# Altium integrated library TI Power Management Battery Management.IntLib: 950 symbols (part 12 of 48) (continued)
## BQ2054SNG4 (continued)

## BQ2054SNTR
designator U?
Switch-Mode Li-Ion Battery Charger in PDIP or SOIC Package, 4.5 V, 16-pin SOIC (D), Green (RoHS & no Sb/Br); PartNumber: BQ2054SNTR; Manufacturer: Texas Instruments; Lead Acid: N; Li-Ion: Y; SubFamily: Battery Charge Management; Vin(Min)(V): 4.5; PackageVersion: revM, Jun-2011; PackageReference: D16; PackageDescription: 16-Pin Plastic Small Outline Integrated Circuit, 9.9 x 3.9 mm, Pitch 1.27 mm Pitch; Supplier 1: Digi-Key; Supplier Part Number 1: BQ2054SNTR-ND; Supplier Part Number 3: 595-BQ2054SNTR; Eco-Plan: Green (RoHS & no Sb/Br); Li-Polymer: Y; NiCd: N; NiMH: N; Over Voltage Protection: N; Mounting Technology: Surface Mount; Code_JEDEC: MS-012AC; ComponentLink1Description: Datasheet; ComponentLink1URL: http://www.ti.com/general/docs/lit/getliterature.tsp?genericPartNumber=BQ2054&fileType=pdf
footprint D16_N (SOIC, 16-Leads, Body 9.9x3.9mm, Pitch 1.27mm, IPC Medium Density)
footprint D16_L (SOIC, 16-Leads, Body 9.9x3.9mm, Pitch 1.27mm, IPC High Density)
footprint D16_M (SOIC, 16-Leads, Body 9.9x3.9mm, Pitch 1.27mm, IPC Low Density)
pins: 1 TM (in) "This input sets the maximum charge time.The resistor and capacitor values are determined using Equation 5. Figure 7 shows the resistor/capacitor connection.", 2 ~{ICTL} (out) "I\C\T\L\ is driven low during the fault or charge-complete states of the chip. It is used to disconnect the capacitor across the battery pack terminals, preventing inrush currents from tripping overcurrent protection (See Datasheet)", 3 BAT (in) "BAT is the battery voltage sense input. This potential is generally developed using a high-impedance resistor divider network connected between the positive and the negative terminals of the battery. See Figure 4 and (See Datasheet)", 4 VCOMP (in) "This input uses an external R-C network for voltage loop stability", 5 ICOMP (in) "This input uses an external R-C network for current loop stability.", 6 ITERM "This three-state input is used to set IMIN for fast charge termination. See Table 2.", 7 SNS (in) "Battery current is sensed via the voltage developed on this pin by an external sense resistor,RSNS, connected in series with the negative terminal of the battery pack. See Equation 6.", 8 TS (in) "This input is used to monitor battery temperature.An external resistor divider network sets the lower and upper temperature thresholds.See Figure 6 and Equations 3 and 4.", 9 TPWM (in) "This input uses an external timing capacitor to ground to set the pulse-width modulation (PWM) frequency. See Equation 7.", 10 LED3 (hiz) "This charger status output driver is for the direct drive of the LED display. Display modes are shown in Table 1. These outputs are tri-stated during initialization so that DSEL can be read.", 11 LCOM (hiz) "Common output for LED1-3. This output is in a high-impedance state during initialization to read programming input on DSEL.", 12 VSS (power) "Ground", 13 VCC (power) "5.0V, +/- 10% power", 14 MOD (out) "MOD is a pulse-width modulated push/pull output that is used to control the charging current to the battery. MOD switches high to enable current flow and low to inhibit current flow.", 15 LED1 (hiz) "This charger status output driver is for the direct drive of the LED display. Display modes are shown in Table 1. This output is tri-stated during initialization so that DSEL can be read.", 16 LED2/DSEL (io) "This charger status output driver is for the direct drive of the LED display. Display modes are shown in Table 1. This output is tri-stated during initialization so that DSEL can be read./This three-level input controls the (See Datasheet)"

## BQ2054SNTRG4
designator U?
Switch-Mode Li-Ion Battery Charger in PDIP or SOIC Package, 4.5 V, 16-pin SOIC (D), Green (RoHS & no Sb/Br); PartNumber: BQ2054SNTRG4; Manufacturer: Texas Instruments; Lead Acid: N; Li-Ion: Y; SubFamily: Battery Charge Management; Vin(Min)(V): 4.5; PackageVersion: revM, Jun-2011; PackageReference: D16; PackageDescription: 16-Pin Plastic Small Outline Integrated Circuit, 9.9 x 3.9 mm, Pitch 1.27 mm Pitch; Supplier 1: Digi-Key; Supplier Part Number 1: BQ2054SNTRG4-ND; Supplier Part Number 3: 595-BQ2054SNTRG4; Eco-Plan: Green (RoHS & no Sb/Br); Li-Polymer: Y; NiCd: N; NiMH: N; Over Voltage Protection: N; Mounting Technology: Surface Mount; Code_JEDEC: MS-012AC; ComponentLink1Description: Datasheet; ComponentLink1URL: http://www.ti.com/general/docs/lit/getliterature.tsp?genericPartNumber=BQ2054&fileType=pdf
footprint D16_N (SOIC, 16-Leads, Body 9.9x3.9mm, Pitch 1.27mm, IPC Medium Density)
footprint D16_L (SOIC, 16-Leads, Body 9.9x3.9mm, Pitch 1.27mm, IPC High Density)
footprint D16_M (SOIC, 16-Leads, Body 9.9x3.9mm, Pitch 1.27mm, IPC Low Density)
pins: 1 TM (in) "This input sets the maximum charge time.The resistor and capacitor values are determined using Equation 5. Figure 7 shows the resistor/capacitor connection.", 2 ~{ICTL} (out) "I\C\T\L\ is driven low during the fault or charge-complete states of the chip. It is used to disconnect the capacitor across the battery pack terminals, preventing inrush currents from tripping overcurrent protection (See Datasheet)", 3 BAT (in) "BAT is the battery voltage sense input. This potential is generally developed using a high-impedance resistor divider network connected between the positive and the negative terminals of the battery. See Figure 4 and (See Datasheet)", 4 VCOMP (in) "This input uses an external R-C network for voltage loop stability", 5 ICOMP (in) "This input uses an external R-C network for current loop stability.", 6 ITERM "This three-state input is used to set IMIN for fast charge termination. See Table 2.", 7 SNS (in) "Battery current is sensed via the voltage developed on this pin by an external sense resistor,RSNS, connected in series with the negative terminal of the battery pack. See Equation 6.", 8 TS (in) "This input is used to monitor battery temperature.An external resistor divider network sets the lower and upper temperature thresholds.See Figure 6 and Equations 3 and 4.", 9 TPWM (in) "This input uses an external timing capacitor to ground to set the pulse-width modulation (PWM) frequency. See Equation 7.", 10 LED3 (hiz) "This charger status output driver is for the direct drive of the LED display. Display modes are shown in Table 1. These outputs are tri-stated during initialization so that DSEL can be read.", 11 LCOM (hiz) "Common output for LED1-3. This output is in a high-impedance state during initialization to read programming input on DSEL.", 12 VSS (power) "Ground", 13 VCC (power) "5.0V, +/- 10% power", 14 MOD (out) "MOD is a pulse-width modulated push/pull output that is used to control the charging current to the battery. MOD switches high to enable current flow and low to inhibit current flow.", 15 LED1 (hiz) "This charger status output driver is for the direct drive of the LED display. Display modes are shown in Table 1. This output is tri-stated during initialization so that DSEL can be read.", 16 LED2/DSEL (io) "This charger status output driver is for the direct drive of the LED display. Display modes are shown in Table 1. This output is tri-stated during initialization so that DSEL can be read./This three-level input controls the (See Datasheet)"

## BQ2057CDGK
designator U?
Low Dropout Linear 1-Cell Li-Ion Charge Controller with AutoCompTM, 4.5 V, -20 to 70 degC, 8-pin MSOP (DGK), Green (RoHS & no Sb/Br); PartNumber: BQ2057CDGK; Manufacturer: Texas Instruments; Lead Acid: N; Li-Ion: Y; SubFamily: Battery Charge Management; Vin(Min)(V): 4.5; DatasheetVersion: SLUS025F; PackageVersion: revE, May-2006; PackageReference: DGK8; PackageDescription: 8-Pin Thin Small Outline Package 3 x 3 mm Body ,0.65 mm Pitch; Supplier 1: Digi-Key; Supplier Part Number 1: 296-11991-5-ND; Supplier Part Number 3: 595-BQ2057CDGK; Eco-Plan: Green (RoHS & no Sb/Br); Li-Polymer: Y; NiCd: N; NiMH: N; Over Voltage Protection: N; Mounting Technology: Surface Mount; Code_JEDEC: MO-187-AA; ComponentLink1Description: Datasheet; ComponentLink1URL: http://www.ti.com/general/docs/lit/getliterature.tsp?genericPartNumber=BQ2057C&fileType=pdf
footprint DGK8_N (TSOP, 8-Leads, Body 3x3mm, Pitch 0.65mm, IPC Medium Density)
footprint DGK8_L (TSOP, 8-Leads, Body 3x3mm, Pitch 0.65mm, IPC High Density)
footprint DGK8_M (TSOP, 8-Leads, Body 3x3mm, Pitch 0.65mm, IPC Low Density)
pins: 1 VCC (power) "Supply voltage", 2 TS (in) "Temperature sense input", 3 STAT (hiz) "Charge status output", 4 VSS (power) "Ground", 5 CC (out) "Charge control output", 6 COMP (in) "Charge-rate compensation input (AutoComp)", 7 SNS (in) "Current sense input", 8 BAT (in) "Voltage sense input"

## BQ2057CDGKG4
designator U?
Low Dropout Linear 1-Cell Li-Ion Charge Controller with AutoCompTM, 4.5 V, -20 to 70 degC, 8-pin MSOP (DGK), Green (RoHS & no Sb/Br); PartNumber: BQ2057CDGKG4; Manufacturer: Texas Instruments; Lead Acid: N; Li-Ion: Y; SubFamily: Battery Charge Management; Vin(Min)(V): 4.5; DatasheetVersion: SLUS025F; PackageVersion: revE, May-2006; PackageReference: DGK8; PackageDescription: 8-Pin Thin Small Outline Package 3 x 3 mm Body ,0.65 mm Pitch; Supplier 1: Digi-Key; Supplier Part Number 1: BQ2057CDGKG4-ND; Supplier Part Number 3: 595-BQ2057CDGKG4; Eco-Plan: Green (RoHS & no Sb/Br); Li-Polymer: Y; NiCd: N; NiMH: N; Over Voltage Protection: N; Mounting Technology: Surface Mount; Code_JEDEC: MO-187-AA; ComponentLink1Description: Datasheet; ComponentLink1URL: http://www.ti.com/general/docs/lit/getliterature.tsp?genericPartNumber=BQ2057C&fileType=pdf
footprint DGK8_N (TSOP, 8-Leads, Body 3x3mm, Pitch 0.65mm, IPC Medium Density)
footprint DGK8_L (TSOP, 8-Leads, Body 3x3mm, Pitch 0.65mm, IPC High Density)
footprint DGK8_M (TSOP, 8-Leads, Body 3x3mm, Pitch 0.65mm, IPC Low Density)
pins: 1 VCC (power) "Supply voltage", 2 TS (in) "Temperature sense input", 3 STAT (hiz) "Charge status output", 4 VSS (power) "Ground", 5 CC (out) "Charge control output", 6 COMP (in) "Charge-rate compensation input (AutoComp)", 7 SNS (in) "Current sense input", 8 BAT (in) "Voltage sense input"

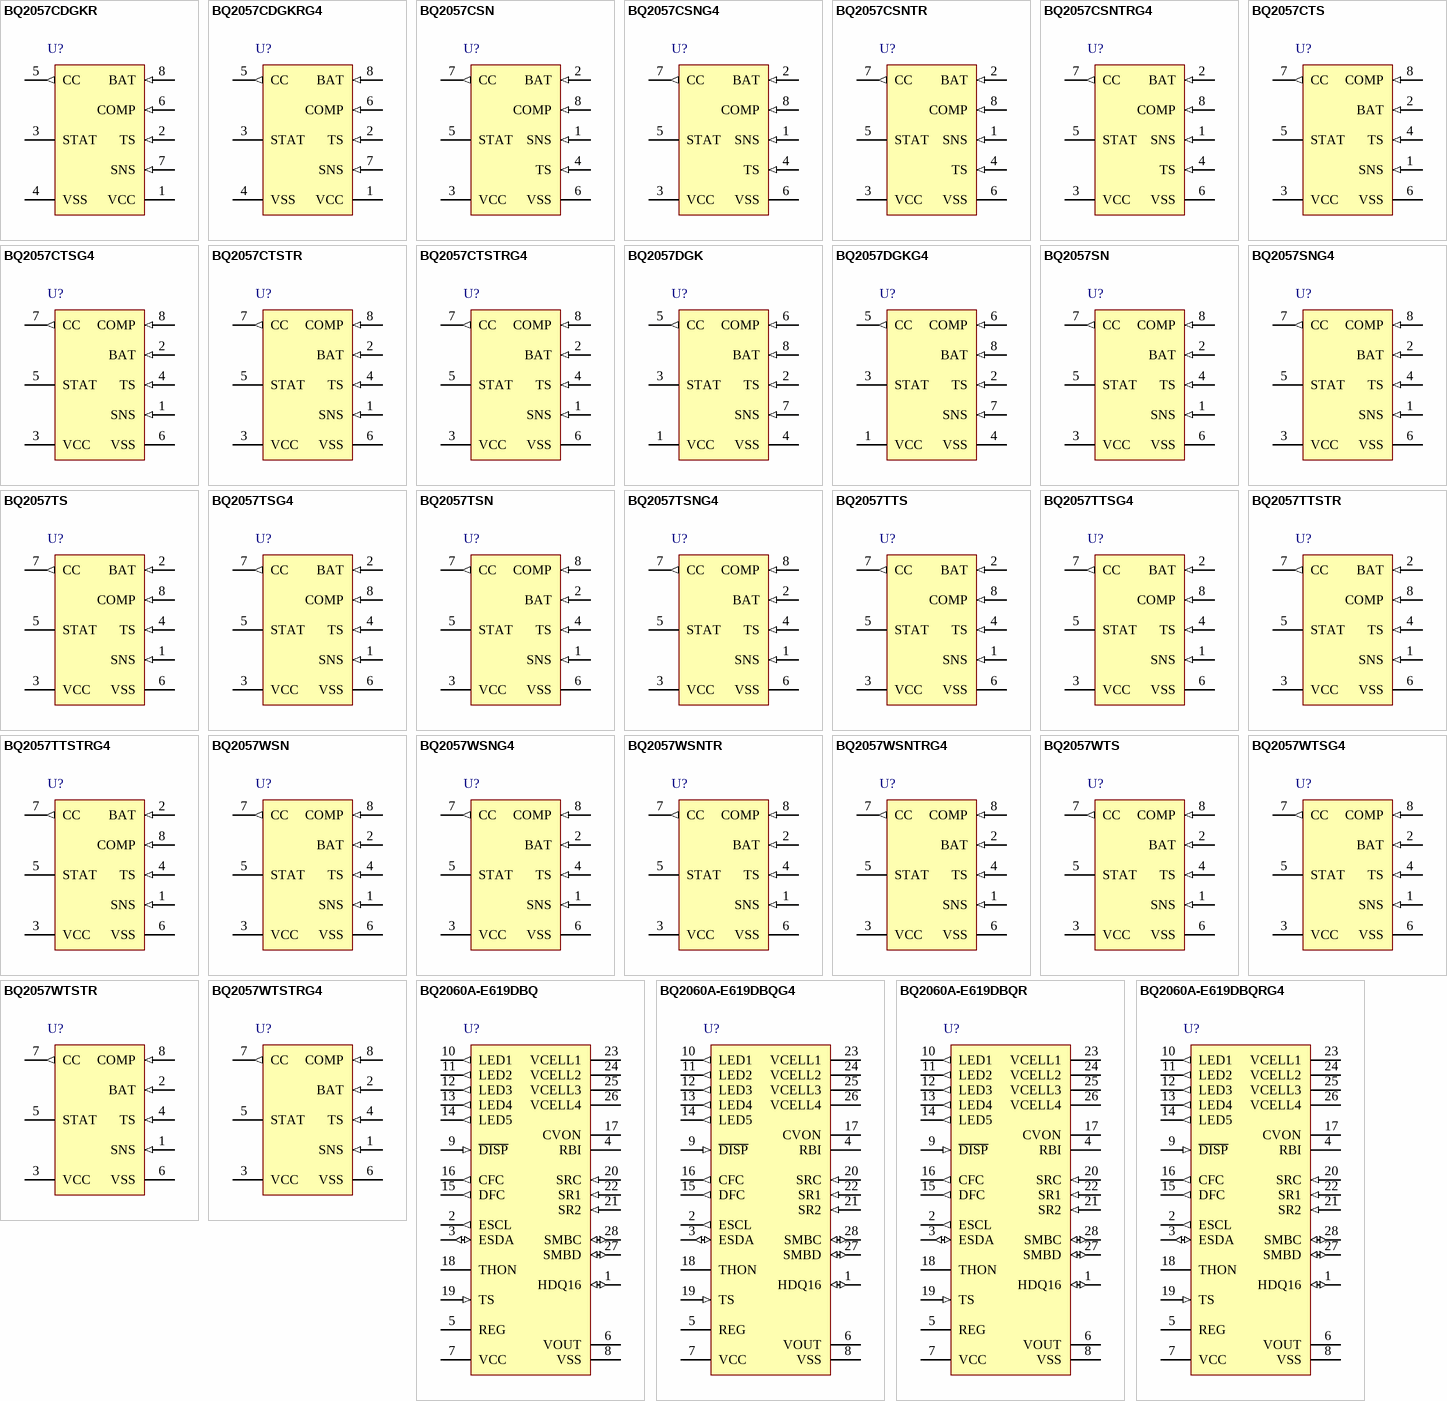
[diagram p8: symbols BQ2057CDGKR to BQ2060A-E619DBQRG4]

## BQ2057CDGKR
designator U?
Low Dropout Linear 1-Cell Li-Ion Charge Controller with AutoCompTM, 4.5 V, -20 to 70 degC, 8-pin MSOP (DGK), Green (RoHS & no Sb/Br); PartNumber: BQ2057CDGKR; Manufacturer: Texas Instruments; Lead Acid: N; Li-Ion: Y; SubFamily: Battery Charge Management; Vin(Min)(V): 4.5; DatasheetVersion: SLUS025F; PackageVersion: revE, May-2006; PackageReference: DGK8; PackageDescription: 8-Pin Thin Small Outline Package 3 x 3 mm Body ,0.65 mm Pitch; Supplier 1: Digi-Key; Supplier Part Number 1: 296-11991-2-ND; Supplier Part Number 3: 296-11991-6-ND; Eco-Plan: Green (RoHS & no Sb/Br); Li-Polymer: Y; NiCd: N; NiMH: N; Over Voltage Protection: N; Mounting Technology: Surface Mount; Code_JEDEC: MO-187-AA; ComponentLink1Description: Datasheet; ComponentLink1URL: http://www.ti.com/general/docs/lit/getliterature.tsp?genericPartNumber=BQ2057C&fileType=pdf
footprint DGK8_N (TSOP, 8-Leads, Body 3x3mm, Pitch 0.65mm, IPC Medium Density)
footprint DGK8_L (TSOP, 8-Leads, Body 3x3mm, Pitch 0.65mm, IPC High Density)
footprint DGK8_M (TSOP, 8-Leads, Body 3x3mm, Pitch 0.65mm, IPC Low Density)
pins: 1 VCC (power) "Supply voltage", 2 TS (in) "Temperature sense input", 3 STAT (hiz) "Charge status output", 4 VSS (power) "Ground", 5 CC (out) "Charge control output", 6 COMP (in) "Charge-rate compensation input (AutoComp)", 7 SNS (in) "Current sense input", 8 BAT (in) "Voltage sense input"

## BQ2057CDGKRG4
designator U?
Low Dropout Linear 1-Cell Li-Ion Charge Controller with AutoCompTM, 4.5 V, -20 to 70 degC, 8-pin MSOP (DGK), Green (RoHS & no Sb/Br); PartNumber: BQ2057CDGKRG4; Manufacturer: Texas Instruments; Lead Acid: N; Li-Ion: Y; SubFamily: Battery Charge Management; Vin(Min)(V): 4.5; DatasheetVersion: SLUS025F; PackageVersion: revE, May-2006; PackageReference: DGK8; PackageDescription: 8-Pin Thin Small Outline Package 3 x 3 mm Body ,0.65 mm Pitch; Supplier 1: Digi-Key; Supplier Part Number 1: BQ2057CDGKRG4-ND; Supplier Part Number 3: 595-BQ2057CDGKRG4; Eco-Plan: Green (RoHS & no Sb/Br); Li-Polymer: Y; NiCd: N; NiMH: N; Over Voltage Protection: N; Mounting Technology: Surface Mount; Code_JEDEC: MO-187-AA; ComponentLink1Description: Datasheet; ComponentLink1URL: http://www.ti.com/general/docs/lit/getliterature.tsp?genericPartNumber=BQ2057C&fileType=pdf
footprint DGK8_N (TSOP, 8-Leads, Body 3x3mm, Pitch 0.65mm, IPC Medium Density)
footprint DGK8_L (TSOP, 8-Leads, Body 3x3mm, Pitch 0.65mm, IPC High Density)
footprint DGK8_M (TSOP, 8-Leads, Body 3x3mm, Pitch 0.65mm, IPC Low Density)
pins: 1 VCC (power) "Supply voltage", 2 TS (in) "Temperature sense input", 3 STAT (hiz) "Charge status output", 4 VSS (power) "Ground", 5 CC (out) "Charge control output", 6 COMP (in) "Charge-rate compensation input (AutoComp)", 7 SNS (in) "Current sense input", 8 BAT (in) "Voltage sense input"

## BQ2057CSN
designator U?
Low Dropout Linear 1-Cell Li-Ion Charge Controller with AutoCompTM, 4.5 V, -20 to 70 degC, 8-pin SOIC (D), Green (RoHS & no Sb/Br); PartNumber: BQ2057CSN; Manufacturer: Texas Instruments; Lead Acid: N; Li-Ion: Y; SubFamily: Battery Charge Management; Vin(Min)(V): 4.5; DatasheetVersion: SLUS025F; PackageVersion: revM, Jun-2011; PackageReference: D8; PackageDescription: 8-Pin Plastic Small Outline Integrated Circuit, 4.9 x 3.9 mm, Pitch 1.27 mm Pitch; Supplier 1: Digi-Key; Supplier Part Number 1: 296-9358-5-ND; Supplier Part Number 3: 74C7587; Eco-Plan: Green (RoHS & no Sb/Br); Li-Polymer: Y; NiCd: N; NiMH: N; Over Voltage Protection: N; Mounting Technology: Surface Mount; Code_JEDEC: MS-012AA; ComponentLink1Description: Datasheet; ComponentLink1URL: http://www.ti.com/general/docs/lit/getliterature.tsp?genericPartNumber=BQ2057C&fileType=pdf
footprint D8_N (SOIC, 8-Leads, Body 4.9x3.9mm, Pitch 1.27mm, IPC Medium Density)
footprint D8_L (SOIC, 8-Leads, Body 4.9x3.9mm, Pitch 1.27mm, IPC High Density)
footprint D8_M (SOIC, 8-Leads, Body 4.9x3.9mm, Pitch 1.27mm, IPC Low Density)
pins: 1 SNS (in) "Current sense input", 2 BAT (in) "Voltage sense input", 3 VCC (power) "Supply voltage", 4 TS (in) "Temperature sense input", 5 STAT (hiz) "Charge status output", 6 VSS (power) "Ground", 7 CC (out) "Charge control output", 8 COMP (in) "Charge-rate compensation input (AutoComp)"

## BQ2057CSNG4
designator U?
Low Dropout Linear 1-Cell Li-Ion Charge Controller with AutoCompTM, 4.5 V, -20 to 70 degC, 8-pin SOIC (D), Green (RoHS & no Sb/Br); PartNumber: BQ2057CSNG4; Manufacturer: Texas Instruments; Lead Acid: N; Li-Ion: Y; SubFamily: Battery Charge Management; Vin(Min)(V): 4.5; DatasheetVersion: SLUS025F; PackageVersion: revM, Jun-2011; PackageReference: D8; PackageDescription: 8-Pin Plastic Small Outline Integrated Circuit, 4.9 x 3.9 mm, Pitch 1.27 mm Pitch; Supplier 1: Digi-Key; Supplier Part Number 1: BQ2057CSNG4-ND; Supplier Part Number 3: 595-BQ2057CSNG4; Eco-Plan: Green (RoHS & no Sb/Br); Li-Polymer: Y; NiCd: N; NiMH: N; Over Voltage Protection: N; Mounting Technology: Surface Mount; Code_JEDEC: MS-012AA; ComponentLink1Description: Datasheet; ComponentLink1URL: http://www.ti.com/general/docs/lit/getliterature.tsp?genericPartNumber=BQ2057C&fileType=pdf
footprint D8_N (SOIC, 8-Leads, Body 4.9x3.9mm, Pitch 1.27mm, IPC Medium Density)
footprint D8_L (SOIC, 8-Leads, Body 4.9x3.9mm, Pitch 1.27mm, IPC High Density)
footprint D8_M (SOIC, 8-Leads, Body 4.9x3.9mm, Pitch 1.27mm, IPC Low Density)
pins: 1 SNS (in) "Current sense input", 2 BAT (in) "Voltage sense input", 3 VCC (power) "Supply voltage", 4 TS (in) "Temperature sense input", 5 STAT (hiz) "Charge status output", 6 VSS (power) "Ground", 7 CC (out) "Charge control output", 8 COMP (in) "Charge-rate compensation input (AutoComp)"

## BQ2057CSNTR
designator U?
Low Dropout Linear 1-Cell Li-Ion Charge Controller with AutoCompTM, 4.5 V, -20 to 70 degC, 8-pin SOIC (D), Green (RoHS & no Sb/Br); PartNumber: BQ2057CSNTR; Manufacturer: Texas Instruments; Lead Acid: N; Li-Ion: Y; SubFamily: Battery Charge Management; Vin(Min)(V): 4.5; DatasheetVersion: SLUS025F; PackageVersion: revM, Jun-2011; PackageReference: D8; PackageDescription: 8-Pin Plastic Small Outline Integrated Circuit, 4.9 x 3.9 mm, Pitch 1.27 mm Pitch; Supplier 1: Digi-Key; Supplier Part Number 1: BQ2057CSNTR-ND; Supplier Part Number 3: 595-BQ2057CSNTR; Eco-Plan: Green (RoHS & no Sb/Br); Li-Polymer: Y; NiCd: N; NiMH: N; Over Voltage Protection: N; Mounting Technology: Surface Mount; Code_JEDEC: MS-012AA; ComponentLink1Description: Datasheet; ComponentLink1URL: http://www.ti.com/general/docs/lit/getliterature.tsp?genericPartNumber=BQ2057C&fileType=pdf
footprint D8_N (SOIC, 8-Leads, Body 4.9x3.9mm, Pitch 1.27mm, IPC Medium Density)
footprint D8_L (SOIC, 8-Leads, Body 4.9x3.9mm, Pitch 1.27mm, IPC High Density)
footprint D8_M (SOIC, 8-Leads, Body 4.9x3.9mm, Pitch 1.27mm, IPC Low Density)
pins: 1 SNS (in) "Current sense input", 2 BAT (in) "Voltage sense input", 3 VCC (power) "Supply voltage", 4 TS (in) "Temperature sense input", 5 STAT (hiz) "Charge status output", 6 VSS (power) "Ground", 7 CC (out) "Charge control output", 8 COMP (in) "Charge-rate compensation input (AutoComp)"

## BQ2057CSNTRG4
designator U?
Low Dropout Linear 1-Cell Li-Ion Charge Controller with AutoCompTM, 4.5 V, -20 to 70 degC, 8-pin SOIC (D), Green (RoHS & no Sb/Br); PartNumber: BQ2057CSNTRG4; Manufacturer: Texas Instruments; Lead Acid: N; Li-Ion: Y; SubFamily: Battery Charge Management; Vin(Min)(V): 4.5; DatasheetVersion: SLUS025F; PackageVersion: revM, Jun-2011; PackageReference: D8; PackageDescription: 8-Pin Plastic Small Outline Integrated Circuit, 4.9 x 3.9 mm, Pitch 1.27 mm Pitch; Supplier 1: Digi-Key; Supplier Part Number 1: BQ2057CSNTRG4-ND; Supplier Part Number 3: 595-BQ2057CSNTRG4; Eco-Plan: Green (RoHS & no Sb/Br); Li-Polymer: Y; NiCd: N; NiMH: N; Over Voltage Protection: N; Mounting Technology: Surface Mount; Code_JEDEC: MS-012AA; ComponentLink1Description: Datasheet; ComponentLink1URL: http://www.ti.com/general/docs/lit/getliterature.tsp?genericPartNumber=BQ2057C&fileType=pdf
footprint D8_N (SOIC, 8-Leads, Body 4.9x3.9mm, Pitch 1.27mm, IPC Medium Density)
footprint D8_L (SOIC, 8-Leads, Body 4.9x3.9mm, Pitch 1.27mm, IPC High Density)
footprint D8_M (SOIC, 8-Leads, Body 4.9x3.9mm, Pitch 1.27mm, IPC Low Density)
pins: 1 SNS (in) "Current sense input", 2 BAT (in) "Voltage sense input", 3 VCC (power) "Supply voltage", 4 TS (in) "Temperature sense input", 5 STAT (hiz) "Charge status output", 6 VSS (power) "Ground", 7 CC (out) "Charge control output", 8 COMP (in) "Charge-rate compensation input (AutoComp)"

## BQ2057CTS
designator U?
Low Dropout Linear 1-Cell Li-Ion Charge Controller with AutoCompTM, 4.5 V, -20 to 70 degC, 8-pin TSSOP (PW), Green (RoHS & no Sb/Br); PartNumber: BQ2057CTS; Manufacturer: Texas Instruments; Lead Acid: N; Li-Ion: Y; SubFamily: Battery Charge Management; Vin(Min)(V): 4.5; DatasheetVersion: SLUS025F; PackageVersion: revG, Feb-2011; PackageReference: PW8; PackageDescription: 8-Pin Plastic Thin Small Outline Package 3 x 4.4 mm Body ,0.65 mm Pitch; Supplier 1: Digi-Key; Supplier Part Number 1: 296-9359-5-ND; Supplier Part Number 3: 595-BQ2057CTS; Eco-Plan: Green (RoHS & no Sb/Br); Li-Polymer: Y; NiCd: N; NiMH: N; Over Voltage Protection: N; Mounting Technology: Surface Mount; Code_JEDEC: MO-153; ComponentLink1Description: Datasheet; ComponentLink1URL: http://www.ti.com/general/docs/lit/getliterature.tsp?genericPartNumber=BQ2057C&fileType=pdf
footprint PW8_N (TSOP, 8-Leads, Body 3x4.4mm, Pitch 0.65mm, IPC Medium Density)
footprint PW8_L (TSOP, 8-Leads, Body 3x4.4mm, Pitch 0.65mm, IPC High Density)
footprint PW8_M (TSOP, 8-Leads, Body 3x4.4mm, Pitch 0.65mm, IPC Low Density)
pins: 1 SNS (in) "Current sense input", 2 BAT (in) "Voltage sense input", 3 VCC (power) "Supply voltage", 4 TS (in) "Temperature sense input", 5 STAT (hiz) "Charge status output", 6 VSS (power) "Ground", 7 CC (out) "Charge control output", 8 COMP (in) "Charge-rate compensation input (AutoComp)"

## BQ2057CTSG4
designator U?
Low Dropout Linear 1-Cell Li-Ion Charge Controller with AutoCompTM, 4.5 V, -20 to 70 degC, 8-pin TSSOP (PW), Green (RoHS & no Sb/Br); PartNumber: BQ2057CTSG4; Manufacturer: Texas Instruments; Lead Acid: N; Li-Ion: Y; SubFamily: Battery Charge Management; Vin(Min)(V): 4.5; DatasheetVersion: SLUS025F; PackageVersion: revG, Feb-2011; PackageReference: PW8; PackageDescription: 8-Pin Plastic Thin Small Outline Package 3 x 4.4 mm Body ,0.65 mm Pitch; Supplier 1: Digi-Key; Supplier Part Number 1: BQ2057CTSG4-ND; Supplier Part Number 3: 58K5575; Eco-Plan: Green (RoHS & no Sb/Br); Li-Polymer: Y; NiCd: N; NiMH: N; Over Voltage Protection: N; Mounting Technology: Surface Mount; Code_JEDEC: MO-153; ComponentLink1Description: Datasheet; ComponentLink1URL: http://www.ti.com/general/docs/lit/getliterature.tsp?genericPartNumber=BQ2057C&fileType=pdf
footprint PW8_N (TSOP, 8-Leads, Body 3x4.4mm, Pitch 0.65mm, IPC Medium Density)
footprint PW8_L (TSOP, 8-Leads, Body 3x4.4mm, Pitch 0.65mm, IPC High Density)
footprint PW8_M (TSOP, 8-Leads, Body 3x4.4mm, Pitch 0.65mm, IPC Low Density)
pins: 1 SNS (in) "Current sense input", 2 BAT (in) "Voltage sense input", 3 VCC (power) "Supply voltage", 4 TS (in) "Temperature sense input", 5 STAT (hiz) "Charge status output", 6 VSS (power) "Ground", 7 CC (out) "Charge control output", 8 COMP (in) "Charge-rate compensation input (AutoComp)"

## BQ2057CTSTR
designator U?
Low Dropout Linear 1-Cell Li-Ion Charge Controller with AutoCompTM, 4.5 V, -20 to 70 degC, 8-pin TSSOP (PW), Green (RoHS & no Sb/Br); PartNumber: BQ2057CTSTR; Manufacturer: Texas Instruments; Lead Acid: N; Li-Ion: Y; SubFamily: Battery Charge Management; Vin(Min)(V): 4.5; DatasheetVersion: SLUS025F; PackageVersion: revG, Feb-2011; PackageReference: PW8; PackageDescription: 8-Pin Plastic Thin Small Outline Package 3 x 4.4 mm Body ,0.65 mm Pitch; Supplier 1: Digi-Key; Supplier Part Number 1: 296-25916-2-ND; Supplier Part Number 3: 296-25916-6-ND; Eco-Plan: Green (RoHS & no Sb/Br); Li-Polymer: Y; NiCd: N; NiMH: N; Over Voltage Protection: N; Mounting Technology: Surface Mount; Code_JEDEC: MO-153; ComponentLink1Description: Datasheet; ComponentLink1URL: http://www.ti.com/general/docs/lit/getliterature.tsp?genericPartNumber=BQ2057C&fileType=pdf
footprint PW8_N (TSOP, 8-Leads, Body 3x4.4mm, Pitch 0.65mm, IPC Medium Density)
footprint PW8_L (TSOP, 8-Leads, Body 3x4.4mm, Pitch 0.65mm, IPC High Density)
footprint PW8_M (TSOP, 8-Leads, Body 3x4.4mm, Pitch 0.65mm, IPC Low Density)
pins: 1 SNS (in) "Current sense input", 2 BAT (in) "Voltage sense input", 3 VCC (power) "Supply voltage", 4 TS (in) "Temperature sense input", 5 STAT (hiz) "Charge status output", 6 VSS (power) "Ground", 7 CC (out) "Charge control output", 8 COMP (in) "Charge-rate compensation input (AutoComp)"

## BQ2057CTSTRG4
designator U?
Low Dropout Linear 1-Cell Li-Ion Charge Controller with AutoCompTM, 4.5 V, -20 to 70 degC, 8-pin TSSOP (PW), Green (RoHS & no Sb/Br); PartNumber: BQ2057CTSTRG4; Manufacturer: Texas Instruments; Lead Acid: N; Li-Ion: Y; SubFamily: Battery Charge Management; Vin(Min)(V): 4.5; DatasheetVersion: SLUS025F; PackageVersion: revG, Feb-2011; PackageReference: PW8; PackageDescription: 8-Pin Plastic Thin Small Outline Package 3 x 4.4 mm Body ,0.65 mm Pitch; Supplier 1: Digi-Key; Supplier Part Number 1: BQ2057CTSTRG4-ND; Supplier Part Number 3: 595-BQ2057CTSTRG4; Eco-Plan: Green (RoHS & no Sb/Br); Li-Polymer: Y; NiCd: N; NiMH: N; Over Voltage Protection: N; Mounting Technology: Surface Mount; Code_JEDEC: MO-153; ComponentLink1Description: Datasheet; ComponentLink1URL: http://www.ti.com/general/docs/lit/getliterature.tsp?genericPartNumber=BQ2057C&fileType=pdf
footprint PW8_N (TSOP, 8-Leads, Body 3x4.4mm, Pitch 0.65mm, IPC Medium Density)
footprint PW8_L (TSOP, 8-Leads, Body 3x4.4mm, Pitch 0.65mm, IPC High Density)
footprint PW8_M (TSOP, 8-Leads, Body 3x4.4mm, Pitch 0.65mm, IPC Low Density)
pins: 1 SNS (in) "Current sense input", 2 BAT (in) "Voltage sense input", 3 VCC (power) "Supply voltage", 4 TS (in) "Temperature sense input", 5 STAT (hiz) "Charge status output", 6 VSS (power) "Ground", 7 CC (out) "Charge control output", 8 COMP (in) "Charge-rate compensation input (AutoComp)"

## BQ2057DGK
designator U?
Low Dropout Linear 1-Cell Li-Ion Charge Controller with AutoCompTM, 4.5 V, -20 to 70 degC, 8-pin MSOP (DGK), Green (RoHS & no Sb/Br); PartNumber: BQ2057DGK; Manufacturer: Texas Instruments; Lead Acid: N; Li-Ion: Y; SubFamily: Battery Charge Management; Vin(Min)(V): 4.5; DatasheetVersion: SLUS025F; PackageVersion: revE, May-2006; PackageReference: DGK8; PackageDescription: 8-Pin Thin Small Outline Package 3 x 3 mm Body ,0.65 mm Pitch; Supplier 1: Digi-Key; Supplier Part Number 1: 296-11992-5-ND; Supplier Part Number 3: 595-BQ2057DGK; Eco-Plan: Green (RoHS & no Sb/Br); Li-Polymer: Y; NiCd: N; NiMH: N; Over Voltage Protection: N; Mounting Technology: Surface Mount; Code_JEDEC: MO-187-AA; ComponentLink1Description: Datasheet; ComponentLink1URL: http://www.ti.com/general/docs/lit/getliterature.tsp?genericPartNumber=BQ2057&fileType=pdf
footprint DGK8_N (TSOP, 8-Leads, Body 3x3mm, Pitch 0.65mm, IPC Medium Density)
footprint DGK8_L (TSOP, 8-Leads, Body 3x3mm, Pitch 0.65mm, IPC High Density)
footprint DGK8_M (TSOP, 8-Leads, Body 3x3mm, Pitch 0.65mm, IPC Low Density)
pins: 1 VCC (power) "Supply voltage", 2 TS (in) "Temperature sense input", 3 STAT (hiz) "Charge status output", 4 VSS (power) "Ground", 5 CC (out) "Charge control output", 6 COMP (in) "Charge-rate compensation input (AutoComp)", 7 SNS (in) "Current sense input", 8 BAT (in) "Voltage sense input"

## BQ2057DGKG4
designator U?
Low Dropout Linear 1-Cell Li-Ion Charge Controller with AutoCompTM, 4.5 V, -20 to 70 degC, 8-pin MSOP (DGK), Green (RoHS & no Sb/Br); PartNumber: BQ2057DGKG4; Manufacturer: Texas Instruments; Lead Acid: N; Li-Ion: Y; SubFamily: Battery Charge Management; Vin(Min)(V): 4.5; DatasheetVersion: SLUS025F; PackageVersion: revE, May-2006; PackageReference: DGK8; PackageDescription: 8-Pin Thin Small Outline Package 3 x 3 mm Body ,0.65 mm Pitch; Supplier 1: Digi-Key; Supplier Part Number 1: BQ2057DGKG4-ND; Supplier Part Number 3: 595-BQ2057DGKG4; Eco-Plan: Green (RoHS & no Sb/Br); Li-Polymer: Y; NiCd: N; NiMH: N; Over Voltage Protection: N; Mounting Technology: Surface Mount; Code_JEDEC: MO-187-AA; ComponentLink1Description: Datasheet; ComponentLink1URL: http://www.ti.com/general/docs/lit/getliterature.tsp?genericPartNumber=BQ2057&fileType=pdf
footprint DGK8_N (TSOP, 8-Leads, Body 3x3mm, Pitch 0.65mm, IPC Medium Density)
footprint DGK8_L (TSOP, 8-Leads, Body 3x3mm, Pitch 0.65mm, IPC High Density)
footprint DGK8_M (TSOP, 8-Leads, Body 3x3mm, Pitch 0.65mm, IPC Low Density)
pins: 1 VCC (power) "Supply voltage", 2 TS (in) "Temperature sense input", 3 STAT (hiz) "Charge status output", 4 VSS (power) "Ground", 5 CC (out) "Charge control output", 6 COMP (in) "Charge-rate compensation input (AutoComp)", 7 SNS (in) "Current sense input", 8 BAT (in) "Voltage sense input"

## BQ2057SN
designator U?
Low Dropout Linear 1-Cell Li-Ion Charge Controller with AutoCompTM, 4.5 V, -20 to 70 degC, 8-pin SOIC (D), Green (RoHS & no Sb/Br); PartNumber: BQ2057SN; Manufacturer: Texas Instruments; Lead Acid: N; Li-Ion: Y; SubFamily: Battery Charge Management; Vin(Min)(V): 4.5; DatasheetVersion: SLUS025F; PackageVersion: revM, Jun-2011; PackageReference: D8; PackageDescription: 8-Pin Plastic Small Outline Integrated Circuit, 4.9 x 3.9 mm, Pitch 1.27 mm Pitch; Supplier 1: Digi-Key; Supplier Part Number 1: 296-9360-5-ND; Supplier Part Number 3: 74C7592; Eco-Plan: Green (RoHS & no Sb/Br); Li-Polymer: Y; NiCd: N; NiMH: N; Over Voltage Protection: N; Mounting Technology: Surface Mount; Code_JEDEC: MS-012AA; ComponentLink1Description: Datasheet; ComponentLink1URL: http://www.ti.com/general/docs/lit/getliterature.tsp?genericPartNumber=BQ2057&fileType=pdf
footprint D8_N (SOIC, 8-Leads, Body 4.9x3.9mm, Pitch 1.27mm, IPC Medium Density)
footprint D8_L (SOIC, 8-Leads, Body 4.9x3.9mm, Pitch 1.27mm, IPC High Density)
footprint D8_M (SOIC, 8-Leads, Body 4.9x3.9mm, Pitch 1.27mm, IPC Low Density)
pins: 1 SNS (in) "Current sense input", 2 BAT (in) "Voltage sense input", 3 VCC (power) "Supply voltage", 4 TS (in) "Temperature sense input", 5 STAT (hiz) "Charge status output", 6 VSS (power) "Ground", 7 CC (out) "Charge control output", 8 COMP (in) "Charge-rate compensation input (AutoComp)"

## BQ2057SNG4
designator U?
Low Dropout Linear 1-Cell Li-Ion Charge Controller with AutoCompTM, 4.5 V, -20 to 70 degC, 8-pin SOIC (D), Green (RoHS & no Sb/Br); PartNumber: BQ2057SNG4; Manufacturer: Texas Instruments; Lead Acid: N; Li-Ion: Y; SubFamily: Battery Charge Management; Vin(Min)(V): 4.5; DatasheetVersion: SLUS025F; PackageVersion: revM, Jun-2011; PackageReference: D8; PackageDescription: 8-Pin Plastic Small Outline Integrated Circuit, 4.9 x 3.9 mm, Pitch 1.27 mm Pitch; Supplier 1: Digi-Key; Supplier Part Number 1: BQ2057SNG4-ND; Supplier Part Number 3: 595-BQ2057SNG4; Eco-Plan: Green (RoHS & no Sb/Br); Li-Polymer: Y; NiCd: N; NiMH: N; Over Voltage Protection: N; Mounting Technology: Surface Mount; Code_JEDEC: MS-012AA; ComponentLink1Description: Datasheet; ComponentLink1URL: http://www.ti.com/general/docs/lit/getliterature.tsp?genericPartNumber=BQ2057&fileType=pdf
footprint D8_N (SOIC, 8-Leads, Body 4.9x3.9mm, Pitch 1.27mm, IPC Medium Density)
footprint D8_L (SOIC, 8-Leads, Body 4.9x3.9mm, Pitch 1.27mm, IPC High Density)
footprint D8_M (SOIC, 8-Leads, Body 4.9x3.9mm, Pitch 1.27mm, IPC Low Density)
pins: 1 SNS (in) "Current sense input", 2 BAT (in) "Voltage sense input", 3 VCC (power) "Supply voltage", 4 TS (in) "Temperature sense input", 5 STAT (hiz) "Charge status output", 6 VSS (power) "Ground", 7 CC (out) "Charge control output", 8 COMP (in) "Charge-rate compensation input (AutoComp)"

## BQ2057TS
designator U?
Low Dropout Linear 1-Cell Li-Ion Charge Controller with AutoCompTM, 4.1 V, 4.5 V, -20 to 70 degC, 8-pin TSSOP (PW), Green (RoHS & no Sb/Br); PartNumber: BQ2057TS; Manufacturer: Texas Instruments; Lead Acid: N; Li-Ion: Y; SubFamily: Battery Charge Management; Vin(Min)(V): 4.5; DatasheetVersion: SLUS025F; PackageVersion: revG, Feb-2011; PackageReference: PW8; PackageDescription: 8-Pin Plastic Thin Small Outline Package 3 x 4.4 mm Body ,0.65 mm Pitch; Supplier 1: Digi-Key; Supplier Part Number 1: 296-9361-5-ND; Supplier Part Number 3: 74C7594; Eco-Plan: Green (RoHS & no Sb/Br); Li-Polymer: Y; NiCd: N; NiMH: N; Over Voltage Protection: N; Mounting Technology: Surface Mount; Code_JEDEC: MO-153; ComponentLink1Description: Datasheet; ComponentLink1URL: http://www.ti.com/general/docs/lit/getliterature.tsp?genericPartNumber=BQ2057&fileType=pdf
footprint PW8_N (TSOP, 8-Leads, Body 3x4.4mm, Pitch 0.65mm, IPC Medium Density)
footprint PW8_L (TSOP, 8-Leads, Body 3x4.4mm, Pitch 0.65mm, IPC High Density)
footprint PW8_M (TSOP, 8-Leads, Body 3x4.4mm, Pitch 0.65mm, IPC Low Density)
pins: 1 SNS (in) "Current sense input", 2 BAT (in) "Voltage sense input", 3 VCC (power) "Supply voltage", 4 TS (in) "Temperature sense input", 5 STAT (hiz) "Charge status output", 6 VSS (power) "Ground", 7 CC (out) "Charge control output", 8 COMP (in) "Charge-rate compensation input (AutoComp)"